# Altium footprint library OXI_ONE.PcbLib: 74 footprints (part 4 of 5)
Each footprint in its own frame and in the unit in brackets; x right, y up, seen from the top. Pads: shape width x height; smd on the part's side, far side on the other; paste and mask are expansions set on the pad; w line width, h text height; cw(c..) or ccw(c..) is an arc to the next point about the centre after c.
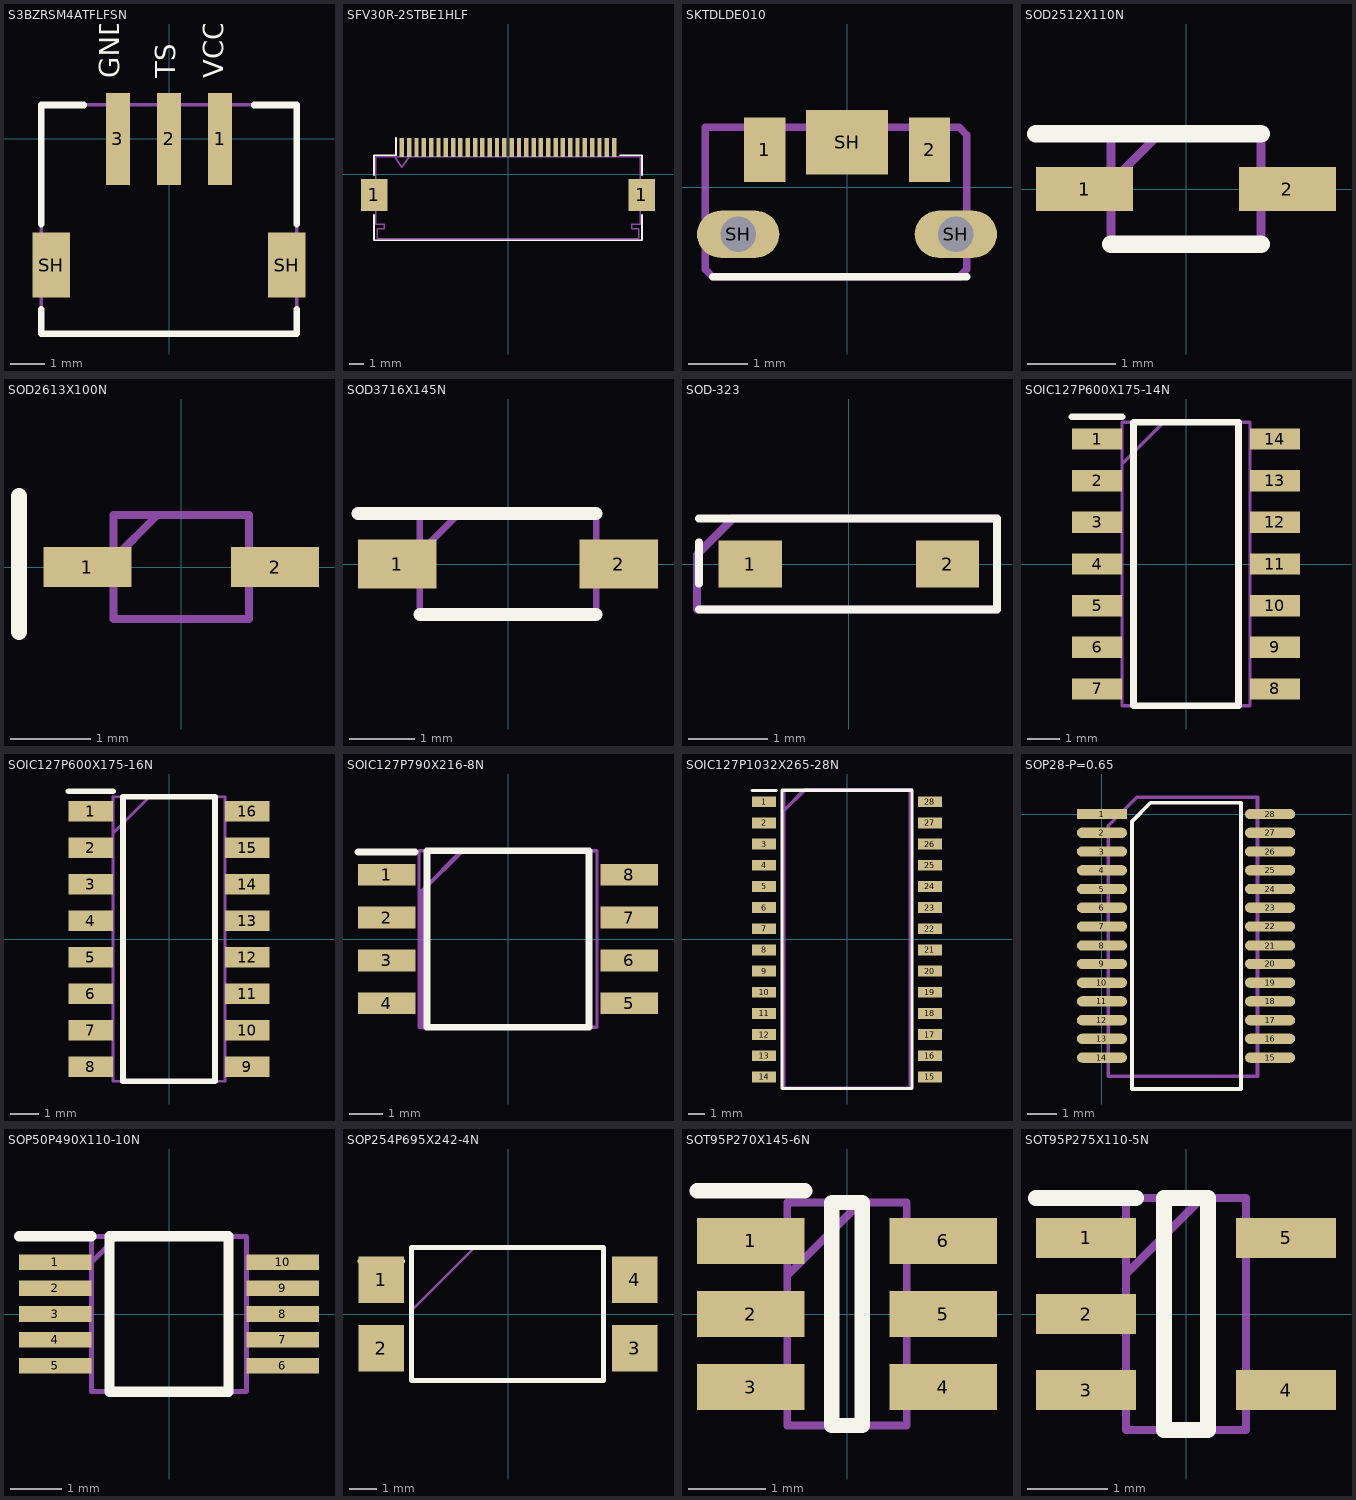
[diagram p3: the footprints below, top view; thin cyan lines are the x and y axes]

## S3BZRSM4ATFLFSN [mm]
pads (5):
  rect 0.7x2.7 smd: 1(1.5,0) 2(0,0) 3(-1.5,0)
  rect 1.1x1.9 smd: SH(-3.45,-3.7) SH(3.45,-3.7)
Top Overlay:
  lines w0.2: -3.75,-5 -3.75,-5.715 3.75,-5.715 3.75,-5 ; -3.75,-2.5 -3.75,1 -2.5,1 ; 2.5,1 3.75,1 3.75,-2.5
  text "GND" at -1.27,1.778 h1
  text "TS" at 0.381,1.778 h1
  text "VCC" at 1.778,1.778 h1
Top Assembly (Mech29):
  lines w0.1: -3.75,-5.715 -3.75,1 3.75,1 3.75,-5.715 -3.75,-5.715
  text ".Designator" at -1.905,-3.556 h1
3D body "S3B-ZR-SM4A-TF.STEP": height 3.7, standoff 0, extent -3.75,-5.715 3.75,0.785

## SFV30R-2STBE1HLF [mm]
pads (32):
  rect 1.8x2.2 smd mask+0.051: 1(-9.15,-1.4) 1(9.15,-1.4)
  rect 0.3x1.3 smd mask+0.051: 1(-7.25,1.85) 2(-6.75,1.85) 3(-6.25,1.85) 4(-5.75,1.85) 5(-5.25,1.85) 6(-4.75,1.85) 7(-4.25,1.85) 8(-3.75,1.85) 9(-3.25,1.85) 10(-2.75,1.85) 11(-2.25,1.85) 12(-1.75,1.85) 13(-1.25,1.85) 14(-0.75,1.85) 15(-0.25,1.85) 16(0.25,1.85) 17(0.75,1.85) 18(1.25,1.85) 19(1.75,1.85) 20(2.25,1.85) 21(2.75,1.85) 22(3.25,1.85) 23(3.75,1.85) 24(4.25,1.85) 25(4.75,1.85) 26(5.25,1.85) 27(5.75,1.85) 28(6.25,1.85) 29(6.75,1.85) 30(7.25,1.85)
Top Overlay:
  lines w0.12: -9.15,-2.76 -9.15,-4.5 9.15,-4.5 9.15,-2.76 ; -9.15,-0.04 -9.15,1.3 -7.66,1.3 -7.66,2.5 ; 7.66,1.3 9.15,1.3 9.15,-0.04
Top Assembly (Mech29):
  lines w0.1: -7.75,1.2 -7.25,0.493 -6.75,1.2 ; -9.05,-3.4 -8.45,-3.4 -8.45,-3.7 -8.95,-3.7 -8.95,-4.4 0,-4.4 8.95,-4.4 8.95,-3.7 8.45,-3.7 8.45,-3.4 9.05,-3.4 9.05,1.2 0,1.2 -9.05,1.2 -9.05,-3.4
  text ".Designator" at -1.143,-1.905 h1
3D body "ssfv30r_2stlf.stp": height 1.82, standoff -0.05, extent -13.68,-6.018 6.82,-1.118

## SKTDLDE010 [mm]
pads (5):
  rect 0.7x1.1 smd: 1(-1.397,0.635) 2(1.403,0.635)
  oval 1.4x0.8 hole 0.6: SH(-1.85,-0.8) SH(1.85,-0.8)
  rect 1.4x1.1 smd: SH(0,0.762)
Top Overlay:
  lines w0.127: -2.286,-1.524 -1.397,-1.524 2.032,-1.524
Top Assembly (Mech29):
  lines w0.127: -2.413,-1.397 -2.413,1.016 1.905,1.016 2.032,0.889 2.032,-1.397 1.905,-1.524 -2.286,-1.524 -2.413,-1.397
  text ".Designator" at -1.397,-0.762 h1
3D body "SKTDLDE010.step": height 1.58, standoff -0.42, extent -1.95,-2.304 1.95,0.731

## SOD2512X110N [mm]
pads (2):
  rect 1.1x0.5 smd: 1(-1.15,0) 2(1.15,0)
Top Overlay:
  lines w0.2: -1.7,0.625 0.85,0.625 ; -0.85,-0.625 0.85,-0.625
Top Assembly (Mech29):
  lines w0.1: -0.85,0.075 -0.3,0.625 ; -0.85,-0.625 -0.85,0.625 0.85,0.625 0.85,-0.625 -0.85,-0.625
  text "K" at -1.613,-0.343 h1
  text ".Designator" at -0.635,-0.381 h1
3D body "1N4148WS-HF.stp": height 1, standoff 0, extent -1.3,-0.65 1.3,0.65

## SOD2613X100N [mm]
pads (2):
  rect 1.1x0.5 smd: 1(-1.175,0) 2(1.175,0)
Top Overlay:
  lines w0.2: -2.032,-0.811 -2.032,0.889
Top Assembly (Mech29):
  lines w0.1: -0.85,0.1 -0.3,0.65 ; -0.85,-0.65 0.85,-0.65 0.85,0.65 -0.85,0.65 -0.85,-0.65
  text ".Designator" at -0.635,-0.508 h1
  text "K" at -1.905,-0.127 h1
3D body "1N4148WS-HF.stp": height 1, standoff 0, extent -1.3,-0.65 1.3,0.65

## SOD3716X145N [mm]
pads (2):
  rect 1.2x0.75 smd: 1(-1.7,0) 2(1.7,0)
Top Overlay:
  lines w0.2: -2.3,0.775 1.35,0.775 ; -1.35,-0.775 1.35,-0.775
Top Assembly (Mech29):
  lines w0.1: -1.35,0.175 -0.75,0.775 ; -1.35,-0.775 -1.35,0.775 1.35,0.775 1.35,-0.775 -1.35,-0.775
  text ".Designator" at -1.143,-0.762 h1
  text "K" at -2.159,-0.127 h1
3D body "1N5819HW-7-F.stp": height 1.45, standoff 0, extent -1.85,-0.775 1.85,0.775

## SOD-323 [mm]
pads (2):
  rect 0.8x0.6 smd: 1(-1.25,0) 2(1.25,0)
Top Overlay:
  lines w0.1: -1.9,-0.575 1.875,-0.575 1.875,0.575 -1.9,0.575 ; -1.9,-0.25 -1.9,0.275
Top Assembly (Mech29):
  lines w0.1: 1.875,0.575 -1.47,0.575 -1.925,0.12 -1.925,-0.575 0.75,-0.575 1.875,-0.575 1.875,0.575 ; 1.875,0.575 1.875,0.575
  text "K" at -2.286,0.432 h1
  text ".Designator" at -1.6,-0.4 h1
3D body "SOD323.step": height 0.9, standoff -0.09, extent -1.225,-0.625 1.275,0.625

## SOIC127P600X175-14N [mm]
pads (14):
  rect 1.525x0.65 smd: 1(-2.712,3.81) 2(-2.712,2.54) 3(-2.712,1.27) 4(-2.712,0) 5(-2.712,-1.27) 6(-2.712,-2.54) 7(-2.712,-3.81) 8(2.712,-3.81) 9(2.712,-2.54) 10(2.712,-1.27) 11(2.712,0) 12(2.712,1.27) 13(2.712,2.54) 14(2.712,3.81)
Top Overlay:
  lines w0.2: -3.475,4.485 -1.95,4.485 ; -1.6,-4.325 -1.6,4.325 1.6,4.325 1.6,-4.325 -1.6,-4.325
Top Assembly (Mech29):
  lines w0.1: -1.95,3.055 -0.68,4.325 ; -1.95,-4.325 1.95,-4.325 1.95,4.325 -1.95,4.325 -1.95,-4.325
  text ".Designator" at -0.889,-0.254 h1
3D body "LM324DR.stp": height 1.75, standoff 0, extent -3,-4.325 3,4.325

## SOIC127P600X175-16N [mm]
pads (16):
  rect 1.55x0.7 smd: 1(-2.725,4.445) 2(-2.725,3.175) 3(-2.725,1.905) 4(-2.725,0.635) 5(-2.725,-0.635) 6(-2.725,-1.905) 7(-2.725,-3.175) 8(-2.725,-4.445) 9(2.725,-4.445) 10(2.725,-3.175) 11(2.725,-1.905) 12(2.725,-0.635) 13(2.725,0.635) 14(2.725,1.905) 15(2.725,3.175) 16(2.725,4.445)
Top Overlay:
  lines w0.2: -3.5,5.145 -1.95,5.145 ; -1.6,-4.95 1.6,-4.95 1.6,4.95 -1.6,4.95 -1.6,-4.95
Top Assembly (Mech29):
  lines w0.1: -1.95,3.68 -0.68,4.95 ; -1.95,-4.95 1.95,-4.95 1.95,4.95 -1.95,4.95 -1.95,-4.95
  text ".Designator" at 0.508,-2.032 h1
3D body "HEF4094BT.stp": height 1.75, standoff 0, extent -3,-4.95 3,4.95

## SOIC127P790X216-8N [mm]
pads (8):
  rect 1.7x0.65 smd: 1(-3.6,1.905) 2(-3.6,0.635) 3(-3.6,-0.635) 4(-3.6,-1.905) 5(3.6,-1.905) 6(3.6,-0.635) 7(3.6,0.635) 8(3.6,1.905)
Top Overlay:
  lines w0.2: -4.45,2.58 -2.75,2.58 ; -2.4,-2.615 2.4,-2.615 2.4,2.615 -2.4,2.615 -2.4,-2.615
Mechanical 13:
  lines w0.1: -2.64,1.345 -1.37,2.615 ; -2.64,-2.615 2.64,-2.615 2.64,2.615 -2.64,2.615 -2.64,-2.615
Top Assembly (Mech29):
  lines w0.127: -2.54,-2.616 -2.54,1.435 -1.359,2.616 2.426,2.616 2.426,-2.615 -2.54,-2.615
  text ".Designator" at -1.651,-0.508 h1
3D body "GD25Q64CSIGR.stp": height 2.16, standoff 0, extent -3.95,-2.615 3.95,2.615

## SOIC127P1032X265-28N [mm]
pads (28):
  rect 1.45x0.65 smd: 1(-4.975,8.255) 2(-4.975,6.985) 3(-4.975,5.715) 4(-4.975,4.445) 5(-4.975,3.175) 6(-4.975,1.905) 7(-4.975,0.635) 8(-4.975,-0.635) 9(-4.975,-1.905) 10(-4.975,-3.175) 11(-4.975,-4.445) 12(-4.975,-5.715) 13(-4.975,-6.985) 14(-4.975,-8.255) 15(4.975,-8.255) 16(4.975,-6.985) 17(4.975,-5.715) 18(4.975,-4.445) 19(4.975,-3.175) 20(4.975,-1.905) 21(4.975,-0.635) 22(4.975,0.635) 23(4.975,1.905) 24(4.975,3.175) 25(4.975,4.445) 26(4.975,5.715) 27(4.975,6.985) 28(4.975,8.255)
Top Overlay:
  lines w0.2: -5.7,8.93 -4.25,8.93 ; -3.9,-8.95 -3.9,8.95 3.9,8.95 3.9,-8.95 -3.9,-8.95
Mechanical 13:
  lines w0.1: -3.75,7.68 -2.48,8.95 ; -3.75,-8.95 -3.75,8.95 3.75,8.95 3.75,-8.95 -3.75,-8.95
Top Assembly (Mech29):
  lines w0.127: -3.886,-8.89 3.899,-8.89 3.899,9.017 -2.553,9.017 -3.886,7.683 -3.886,7.582 -3.886,-8.89
  text ".Designator" at -2.007,-0.699 h1
3D body "ASI4UE-E-G1-ST.stp": height 2.65, standoff 0, extent -5.162,-8.95 5.162,8.95

## SOP28-P=0.65 [mm]
pads (28):
  rect 1.7x0.35 smd: 1(0,0)
  oval 1.7x0.35 smd: 2(0,-0.635) 3(0,-1.27) 4(0,-1.905) 5(0,-2.54) 6(0,-3.175) 7(0,-3.81) 8(0,-4.455) 9(0,-5.08) 10(0,-5.715) 11(0,-6.35) 12(0,-6.985) 13(0,-7.62) 14(0,-8.255) 15(5.7,-8.255) 16(5.7,-7.62) 17(5.7,-6.985) 18(5.7,-6.35) 19(5.7,-5.715) 20(5.7,-5.08) 21(5.7,-4.455) 22(5.7,-3.81) 23(5.7,-3.175) 24(5.7,-2.54) 25(5.7,-1.905) 26(5.7,-1.27) 27(5.7,-0.635) 28(5.7,0)
Top Overlay:
  lines w0.127: 1.016,-9.319 1.016,-0.254 1.651,0.381 4.716,0.381 4.716,-9.319 1.016,-9.319
Top Assembly (Mech29):
  lines w0.127: 0.216,-8.89 0.216,-0.394 1.181,0.572 5.258,0.572 5.271,0.559 5.271,-8.89 0.216,-8.89
  text ".Designator" at 3.048,-6.731 h1
3D body "TSSOP-28.STEP": height 1.2, standoff 0, extent -0.31,-9.07 6.111,0.63

## SOP50P490X110-10N [mm]
pads (10):
  rect 1.4x0.3 smd: 1(-2.2,1) 2(-2.2,0.5) 3(-2.2,0) 4(-2.2,-0.5) 5(-2.2,-1) 6(2.2,-1) 7(2.2,-0.5) 8(2.2,0) 9(2.2,0.5) 10(2.2,1)
Top Overlay:
  lines w0.2: -2.9,1.5 -1.5,1.5 ; -1.15,-1.5 -1.15,1.5 1.15,1.5 1.15,-1.5 -1.15,-1.5
Top Assembly (Mech29):
  lines w0.1: -1.5,1 -1,1.5 ; -1.5,-1.5 -1.5,1.5 1.5,1.5 1.5,-1.5 -1.5,-1.5
  text ".Designator" at -1.016,-0.635 h1
3D body "MCP4728-E_UN.stp": height 1.1, standoff 0, extent -2.45,-1.5 2.45,1.5

## SOP254P695X242-4N [mm]
pads (4):
  rect 1.68x1.71 smd: 1(-4.695,1.27) 2(-4.695,-1.27) 3(4.695,-1.27) 4(4.695,1.27)
Top Overlay:
  lines w0.2: -5.47,1.945 -3.92,1.945 ; -3.57,-2.46 3.535,-2.46 3.535,2.46 -3.57,2.46 -3.57,-2.46
Top Assembly (Mech29):
  lines w0.1: -3.582,0.118 -1.24,2.46 ; -3.577,-2.46 -3.577,2.46 3.509,2.46 3.509,-2.46 -3.577,-2.46
  text ".Designator" at -2.307,-0.711 h1

## SOT95P270X145-6N [mm]
pads (6):
  rect 1.4x0.6 smd: 1(-1.25,0.95) 2(-1.25,0) 3(-1.25,-0.95) 4(1.25,-0.95) 5(1.25,0) 6(1.25,0.95)
Top Overlay:
  lines w0.2: -1.95,1.6 -0.55,1.6 ; -0.2,-1.45 -0.2,1.45 0.2,1.45 0.2,-1.45 -0.2,-1.45
Top Assembly (Mech29):
  lines w0.1: -0.775,0.5 0.175,1.45 ; -0.775,-1.45 -0.775,1.45 0.775,1.45 0.775,-1.45 -0.775,-1.45
  text ".Designator" at 0.381,-1.27 h1
3D body "MCP1501T-33E_CHY.stp": height 1.45, standoff 0, extent -1.35,-1.45 1.35,1.45

## SOT95P275X110-5N [mm]
pads (5):
  rect 1.25x0.5 smd: 1(-1.25,0.95) 2(-1.25,0) 3(-1.25,-0.95) 4(1.25,-0.95) 5(1.25,0.95)
Top Overlay:
  lines w0.2: -1.875,1.45 -0.625,1.45 ; -0.275,-1.45 -0.275,1.45 0.275,1.45 0.275,-1.45 -0.275,-1.45
Top Assembly (Mech29):
  lines w0.1: -0.75,0.5 0.2,1.45 ; -0.75,-1.45 0.75,-1.45 0.75,1.45 -0.75,1.45 -0.75,-1.45
  text ".Designator" at 0.508,-1.397 h1
3D body "74HC1G125GV,125.stp": height 1.1, standoff 0, extent -1.375,-1.45 1.375,1.45